# Altium footprint library TeCrea-Misc.PCBLIB: 105 footprints (part 6 of 7)
Each footprint in its own frame and in the unit in brackets; x right, y up, seen from the top. Pads: shape width x height; smd on the part's side, far side on the other; paste and mask are expansions set on the pad; w line width, h text height; cw(c..) or ccw(c..) is an arc to the next point about the centre after c.
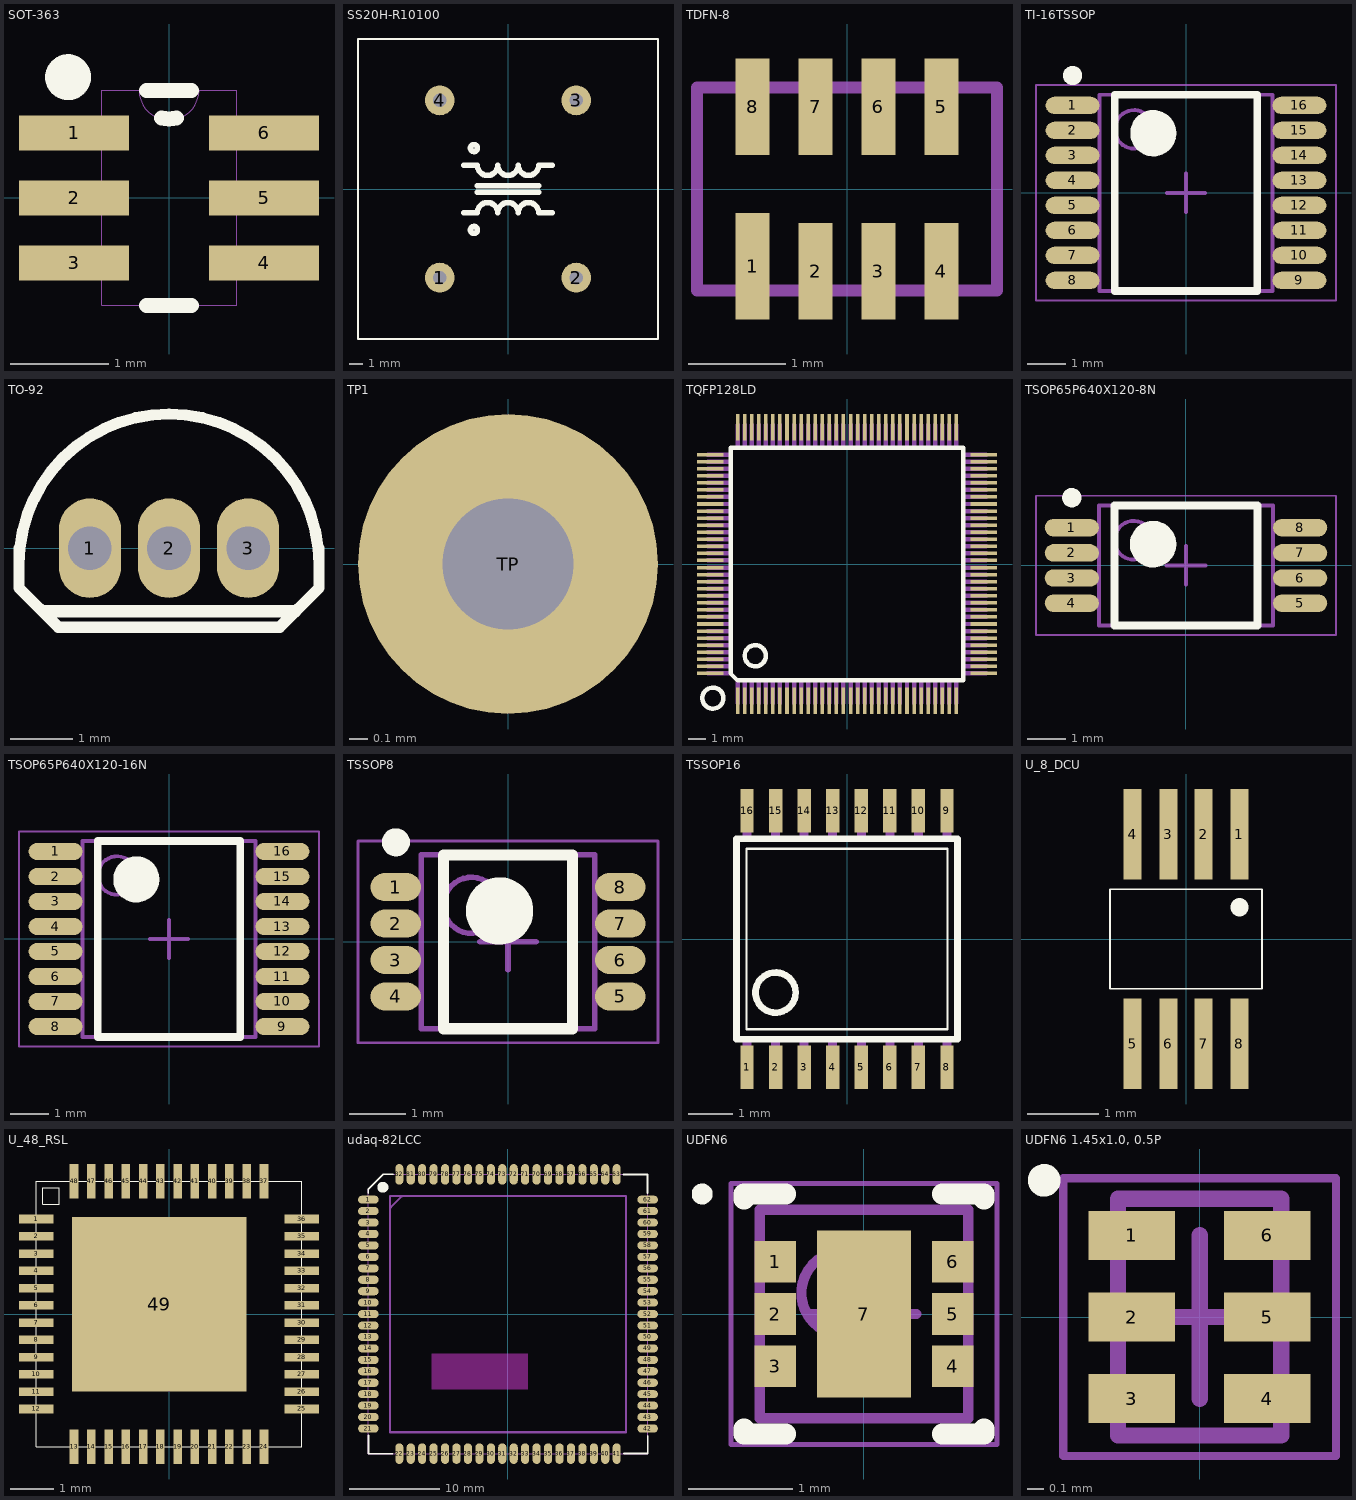
[diagram p5: the footprints below, top view; thin cyan lines are the x and y axes]

## SOT-363 [mil]
pads (6):
  rect 44x14 smd: 1(-38,26) 2(-38,0) 3(-38,-26) 4(38,-26) 5(38,0) 6(38,26)
Top Overlay:
  circle w10: c-40.35,48.23 r4.18
  lines w6: -9,-43 9,-43 ; -9,43 9,43 ; -3,32 ccw(c0,42.13) 3,32
Mechanical 16:
  lines w0: -27,-31 -27,-20 ; -27,-31 -27,-43 27,-43 27,-31 ; -27,-31 -43,-31 -43,-20 -27,-20 ; -27,-20 -27,-6 ; -27,-6 -27,6 ; -27,-6 -43,-6 -43,6 -27,6 ; -27,6 -27,20 ; -27,20 -27,31 ; -27,20 -43,20 -43,31 -27,31 ; -27,31 -27,43 -12,43 ; -12,43 ccw(c0,43) 12,43 ; -12,43 12,43 ; 12,43 27,43 27,31 ; 27,-31 27,-20 ; 27,-31 43,-31 43,-20 27,-20 ; 27,-20 27,-6 ; 27,-6 27,6 ; 27,-6 43,-6 43,6 27,6 ; 27,6 27,20 ; 27,20 27,31 ; 27,20 43,20 43,31 27,31
3D body "SOT363.step": height 39.37, standoff 0, extent -45.27,-41.34 45.28,41.34

## SS20H-R10100 [mm]
pads (4):
  round 2.184 hole 1: 1(-5,-6.5) 2(5,-6.5) 3(5,6.5) 4(-5,6.5)
Top Overlay:
  circle w0.406: c-2.5,3 r0.25
  circle w0.406: c-2.5,-3 r0.25
  lines w0.127: -11,-11 11,-11 11,11 -11,11 -11,-11
  lines w0.406: -3.25,-1.75 -2.25,-1.75 cw(c-1.5,-1.75) -0.75,-1.75 cw(c0,-1.75) 0.75,-1.75 cw(c1.5,-1.75) 2.25,-1.75 3.25,-1.75 ; -3.25,1.75 -2.25,1.75 ccw(c-1.5,1.75) -0.75,1.75 ccw(c0,1.75) 0.75,1.75 ccw(c1.5,1.75) 2.25,1.75 3.25,1.75 ; -2.25,-0.25 2.25,-0.25 ; -2.25,0.25 2.25,0.25
3D body "User Library-Kemet_Filter_SS20H.step": height 18.5, standoff -3.5, extent -11,-11 11,11

## TDFN-8 [mm]
pads (8):
  rect 0.35x1.1 smd: 1(-0.975,-0.8)
  rect 0.35x1 smd: 2(-0.325,-0.85) 3(0.325,-0.85) 4(0.975,-0.85) 5(0.975,0.85) 6(0.325,0.85) 7(-0.325,0.85) 8(-0.975,0.85)
Mechanical 16:
  lines w0.127: -1.55,-1.05 -1.55,1.05 1.55,1.05 1.55,-1.05 -1.55,-1.05
3D body: height 0.75, standoff 0, extent -1.549,-1.041 1.549,1.016
3D body: height 0.75, standoff 0, extent -1.422,-0.914 -1.168,-0.66

## TI-16TSSOP [mm]
height 1.2
pads (16):
  oval 1.4x0.45 smd: 1(-2.95,2.275) 2(-2.95,1.625) 3(-2.95,0.975) 4(-2.95,0.325) 5(-2.95,-0.325) 6(-2.95,-0.975) 7(-2.95,-1.625) 8(-2.95,-2.275) 9(2.95,-2.275) 10(2.95,-1.625) 11(2.95,-0.975) 12(2.95,-0.325) 13(2.95,0.325) 14(2.95,0.975) 15(2.95,1.625) 16(2.95,2.275)
Top Overlay:
  circle w0.25: c-2.95,3.05 r0.125
  circle w0.6: c-0.85,1.55 r0.3
  lines w0.2: -1.85,-2.55 -1.85,2.55 1.85,2.55 1.85,-2.55 -1.85,-2.55
Courtyard Top:
  lines w0.05: -3.9,-2.8 -3.9,2.8 3.9,2.8 3.9,-2.8 -3.9,-2.8
  lines w0.1: -0.5,0 0.5,0 ; 0,-0.5 0,0.5
Assembly Top:
  circle w0.1: c-1.35,1.65 r0.5
  lines w0.1: -2.25,-2.55 -2.25,2.55 2.25,2.55 2.25,-2.55 -2.25,-2.55
3D body "TI-16TSSOP.step": height 1.2, standoff 0, extent -3.2,-2.55 3.2,2.55

## TO-92 [mm]
pads (3):
  oval 1x1.6 hole 0.7: 1(-48.26,0) 2(-46.99,0) 3(-45.72,0)
Top Overlay:
  lines w0.18: -49.4,-0.254 cw(c-46.99,-0.254) -44.58,-0.254 ; -49.4,0 -49.4,-0.638 -48.768,-1.27 -45.212,-1.27 -44.58,-0.638 -44.58,0
  lines w0.2: -48.979,-1.016 -44.958,-1.016

## TP1 [mm] "TestPoint"
pads (1):
  round 1.6 hole 0.7: TP(0,0)
3D body "p13-4023.stp": height 14.95, standoff -1.6, extent -0.45,-0.45 0.45,0.45

## TQFP128LD [mm]
pads (128):
  rect 0.2x1.5 smd: 1(-6.2,-7.75) 2(-5.8,-7.75) 3(-5.4,-7.75) 4(-5,-7.75) 5(-4.6,-7.75) 6(-4.2,-7.75) 7(-3.8,-7.75) 8(-3.4,-7.75) 9(-3,-7.75) 10(-2.6,-7.75) 11(-2.2,-7.75) 12(-1.8,-7.75) 13(-1.4,-7.75) 14(-1,-7.75) 15(-0.6,-7.75) 16(-0.2,-7.75) 17(0.2,-7.75) 18(0.6,-7.75) 19(1,-7.75) 20(1.4,-7.75) 21(1.8,-7.75) 22(2.2,-7.75) 23(2.6,-7.75) 24(3,-7.75) 25(3.4,-7.75) 26(3.8,-7.75) 27(4.2,-7.75) 28(4.6,-7.75) 29(5,-7.75) 30(5.4,-7.75) 31(5.8,-7.75) 32(6.2,-7.75) 65(6.2,7.75) 66(5.8,7.75) 67(5.4,7.75) 68(5,7.75) 69(4.6,7.75) 70(4.2,7.75) 71(3.8,7.75) 72(3.4,7.75) 73(3,7.75) 74(2.6,7.75) 75(2.2,7.75) 76(1.8,7.75) 77(1.4,7.75) 78(1,7.75) 79(0.6,7.75) 80(0.2,7.75) 81(-0.2,7.75) 82(-0.6,7.75) 83(-1,7.75) 84(-1.4,7.75) 85(-1.8,7.75) 86(-2.2,7.75) 87(-2.6,7.75) 88(-3,7.75) 89(-3.4,7.75) 90(-3.8,7.75) 91(-4.2,7.75) 92(-4.6,7.75) 93(-5,7.75) 94(-5.4,7.75) 95(-5.8,7.75) 96(-6.2,7.75)
  rect 1.5x0.2 smd: 33(7.75,-6.2) 34(7.75,-5.8) 35(7.75,-5.4) 36(7.75,-5) 37(7.75,-4.6) 38(7.75,-4.2) 39(7.75,-3.8) 40(7.75,-3.4) 41(7.75,-3) 42(7.75,-2.6) 43(7.75,-2.2) 44(7.75,-1.8) 45(7.75,-1.4) 46(7.75,-1) 47(7.75,-0.6) 48(7.75,-0.2) 49(7.75,0.2) 50(7.75,0.6) 51(7.75,1) 52(7.75,1.4) 53(7.75,1.8) 54(7.75,2.2) 55(7.75,2.6) 56(7.75,3) 57(7.75,3.4) 58(7.75,3.8) 59(7.75,4.2) 60(7.75,4.6) 61(7.75,5) 62(7.75,5.4) 63(7.75,5.8) 64(7.75,6.2) 97(-7.75,6.2) 98(-7.75,5.8) 99(-7.75,5.4) 100(-7.75,5) 101(-7.75,4.6) 102(-7.75,4.2) 103(-7.75,3.8) 104(-7.75,3.4) 105(-7.75,3) 106(-7.75,2.6) 107(-7.75,2.2) 108(-7.75,1.8) 109(-7.75,1.4) 110(-7.75,1) 111(-7.75,0.6) 112(-7.75,0.2) 113(-7.75,-0.2) 114(-7.75,-0.6) 115(-7.75,-1) 116(-7.75,-1.4) 117(-7.75,-1.8) 118(-7.75,-2.2) 119(-7.75,-2.6) 120(-7.75,-3) 121(-7.75,-3.4) 122(-7.75,-3.8) 123(-7.75,-4.2) 124(-7.75,-4.6) 125(-7.75,-5) 126(-7.75,-5.4) 127(-7.75,-5.8) 128(-7.75,-6.2)
Top Overlay:
  circle w0.254: c-5.2,-5.2 r0.6
  circle w0.254: c-7.6,-7.6 r0.6
  lines w0.254: -6.6,-6.2 -6.2,-6.6 6.6,-6.6 6.6,6.6 -6.6,6.6 -6.6,-6.2
Mechanical 16:
  lines w0.254: -7.9,-6.2 -6.6,-6.2 ; -7.9,-5.8 -6.6,-5.8 ; -7.9,-5.4 -6.6,-5.4 ; -7.9,-5 -6.6,-5 ; -7.9,-4.6 -6.6,-4.6 ; -7.9,-4.2 -6.6,-4.2 ; -7.9,-3.8 -6.6,-3.8 ; -7.9,-3.4 -6.6,-3.4 ; -7.9,-3 -6.6,-3 ; -7.9,-2.6 -6.6,-2.6 ; -7.9,-2.2 -6.6,-2.2 ; -7.9,-1.8 -6.6,-1.8 ; -7.9,-1.4 -6.6,-1.4 ; -7.9,-1 -6.6,-1 ; -7.9,-0.6 -6.6,-0.6 ; -7.9,-0.2 -6.6,-0.2 ; -7.9,0.2 -6.6,0.2 ; -7.9,0.6 -6.6,0.6 ; -7.9,1 -6.6,1 ; -7.9,1.4 -6.6,1.4 ; -7.9,1.8 -6.6,1.8 ; -7.9,2.2 -6.6,2.2 ; -7.9,2.6 -6.6,2.6 ; -7.9,3 -6.6,3 ; -7.9,3.4 -6.6,3.4 ; -7.9,3.8 -6.6,3.8 ; -7.9,4.2 -6.6,4.2 ; -7.9,4.6 -6.6,4.6 ; -7.9,5 -6.6,5 ; -7.9,5.4 -6.6,5.4 ; -7.9,5.8 -6.6,5.8 ; -7.9,6.2 -6.6,6.2 ; -6.2,-7.9 -6.2,-6.6 ; -6.2,6.6 -6.2,7.9 ; -5.8,-7.9 -5.8,-6.6 ; -5.8,6.6 -5.8,7.9 ; -5.4,-7.9 -5.4,-6.6 ; -5.4,6.6 -5.4,7.9 ; -5,-7.9 -5,-6.6 ; -5,6.6 -5,7.9 ; -4.6,-7.9 -4.6,-6.6 ; -4.6,6.6 -4.6,7.9 ; -4.2,-7.9 -4.2,-6.6 ; -4.2,6.6 -4.2,7.9 ; -3.8,-7.9 -3.8,-6.6 ; -3.8,6.6 -3.8,7.9 ; -3.4,-7.9 -3.4,-6.6 ; -3.4,6.6 -3.4,7.9 ; -3,-7.9 -3,-6.6 ; -3,6.6 -3,7.9 ; -2.6,-7.9 -2.6,-6.6 ; -2.6,6.6 -2.6,7.9 ; -2.2,-7.9 -2.2,-6.6 ; -2.2,6.6 -2.2,7.9 ; -1.8,-7.9 -1.8,-6.6 ; -1.8,6.6 -1.8,7.9 ; -1.4,-7.9 -1.4,-6.6 ; -1.4,6.6 -1.4,7.9 ; -1,-7.9 -1,-6.6 ; -1,6.6 -1,7.9 ; -0.6,-7.9 -0.6,-6.6 ; -0.6,6.6 -0.6,7.9 ; -0.2,-7.9 -0.2,-6.6 ; -0.2,6.6 -0.2,7.9 ; 0.2,-7.9 0.2,-6.6 ; 0.2,6.6 0.2,7.9 ; 0.6,-7.9 0.6,-6.6 ; 0.6,6.6 0.6,7.9 ; 1,-7.9 1,-6.6 ; 1,6.6 1,7.9 ; 1.4,-7.9 1.4,-6.6 ; 1.4,6.6 1.4,7.9 ; 1.8,-7.9 1.8,-6.6 ; 1.8,6.6 1.8,7.9 ; 2.2,-7.9 2.2,-6.6 ; 2.2,6.6 2.2,7.9 ; 2.6,-7.9 2.6,-6.6 ; 2.6,6.6 2.6,7.9 ; 3,-7.9 3,-6.6 ; 3,6.6 3,7.9 ; 3.4,-7.9 3.4,-6.6 ; 3.4,6.6 3.4,7.9 ; 3.8,-7.9 3.8,-6.6 ; 3.8,6.6 3.8,7.9 ; 4.2,-7.9 4.2,-6.6 ; 4.2,6.6 4.2,7.9 ; 4.6,-7.9 4.6,-6.6 ; 4.6,6.6 4.6,7.9 ; 5,-7.9 5,-6.6 ; 5,6.6 5,7.9 ; 5.4,-7.9 5.4,-6.6 ; 5.4,6.6 5.4,7.9 ; 5.8,-7.9 5.8,-6.6 ; 5.8,6.6 5.8,7.9 ; 6.2,-7.9 6.2,-6.6 ; 6.2,6.6 6.2,7.9 ; 6.6,-6.2 7.9,-6.2 ; 6.6,-5.8 7.9,-5.8 ; 6.6,-5.4 7.9,-5.4 ; 6.6,-5 7.9,-5 ; 6.6,-4.6 7.9,-4.6 ; 6.6,-4.2 7.9,-4.2 ; 6.6,-3.8 7.9,-3.8 ; 6.6,-3.4 7.9,-3.4 ; 6.6,-3 7.9,-3 ; 6.6,-2.6 7.9,-2.6 ; 6.6,-2.2 7.9,-2.2 ; 6.6,-1.8 7.9,-1.8 ; 6.6,-1.4 7.9,-1.4 ; 6.6,-1 7.9,-1 ; 6.6,-0.6 7.9,-0.6 ; 6.6,-0.2 7.9,-0.2 ; 6.6,0.2 7.9,0.2 ; 6.6,0.6 7.9,0.6 ; 6.6,1 7.9,1 ; 6.6,1.4 7.9,1.4 ; 6.6,1.8 7.9,1.8 ; 6.6,2.2 7.9,2.2 ; 6.6,2.6 7.9,2.6 ; 6.6,3 7.9,3 ; 6.6,3.4 7.9,3.4 ; 6.6,3.8 7.9,3.8 ; 6.6,4.2 7.9,4.2 ; 6.6,4.6 7.9,4.6 ; 6.6,5 7.9,5 ; 6.6,5.4 7.9,5.4 ; 6.6,5.8 7.9,5.8 ; 6.6,6.2 7.9,6.2
3D body "TQFP128_14x14mm_Pitch0.4mm.step": height 1.1, standoff 0, extent -7.975,-8 8.025,8

## TSOP65P640X120-8N [mm] "TSOP, 8-Leads, Body 3,00x4,40mm, Pitch 0,65mm, IPC Medium Density"
height 1.2
pads (8):
  oval 1.4x0.45 smd: 1(-2.95,0.975) 2(-2.95,0.325) 3(-2.95,-0.325) 4(-2.95,-0.975) 5(2.95,-0.975) 6(2.95,-0.325) 7(2.95,0.325) 8(2.95,0.975)
Top Overlay:
  circle w0.25: c-2.95,1.75 r0.125
  circle w0.6: c-0.85,0.55 r0.3
  lines w0.2: -1.85,-1.55 -1.85,1.55 1.85,1.55 1.85,-1.55 -1.85,-1.55
Courtyard Top:
  lines w0.05: -3.875,-1.8 -3.875,1.8 3.875,1.8 3.875,-1.8 -3.875,-1.8
  lines w0.1: -0.5,0 0.5,0 ; 0,-0.5 0,0.5
Assembly Top:
  circle w0.1: c-1.35,0.65 r0.5
  lines w0.1: -2.25,-1.55 -2.25,1.55 2.25,1.55 2.25,-1.55 -2.25,-1.55
3D body "TSOP65P640X120-8N.step": height 1.2, standoff 0, extent -3.2,-1.55 3.2,1.55

## TSOP65P640X120-16N [mm] "TSOP, 16-Leads, Body 5.00x4.40mm, Pitch 0.65mm, IPC Medium Density"
height 1.2
pads (16):
  oval 1.4x0.45 smd: 1(-2.95,2.275) 2(-2.95,1.625) 3(-2.95,0.975) 4(-2.95,0.325) 5(-2.95,-0.325) 6(-2.95,-0.975) 7(-2.95,-1.625) 8(-2.95,-2.275) 9(2.95,-2.275) 10(2.95,-1.625) 11(2.95,-0.975) 12(2.95,-0.325) 13(2.95,0.325) 14(2.95,0.975) 15(2.95,1.625) 16(2.95,2.275)
Top Overlay:
  circle w0.6: c-0.85,1.55 r0.3
  lines w0.2: -1.85,-2.55 1.85,-2.55 1.85,2.55 -1.85,2.55 -1.85,-2.55
Mechanical 13:
  circle w0.1: c-1.35,1.65 r0.5
  lines w0.1: -2.25,-2.55 2.25,-2.55 2.25,2.55 -2.25,2.55 -2.25,-2.55
Mechanical 15:
  lines w0.05: -3.9,-2.8 3.9,-2.8 3.9,2.8 -3.9,2.8 -3.9,-2.8
  lines w0.1: -0.5,0 0.5,0 ; 0,-0.5 0,0.5
3D body "TSOP65P640X120-16N.step": height 1.2, standoff 0, extent -3.2,-2.55 3.2,2.55

## TSSOP8 [mm] "TSOP, 8-Leads, Body 3.00x3.00mm, Pitch 0.65mm, IPC Medium Density"
height 1.1
pads (8):
  oval 0.9x0.5 smd: 1(-2,0.975) 2(-2,0.325) 3(-2,-0.325) 4(-2,-0.975) 5(2,-0.975) 6(2,-0.325) 7(2,0.325) 8(2,0.975)
Top Overlay:
  circle w0.25: c-2,1.775 r0.125
  circle w0.6: c-0.15,0.55 r0.3
  lines w0.2: -1.15,-1.55 -1.15,1.55 1.15,1.55 1.15,-1.55 -1.15,-1.55
Mechanical 13:
  circle w0.1: c-0.65,0.65 r0.5
  lines w0.1: -1.55,-1.55 -1.55,1.55 1.55,1.55 1.55,-1.55 -1.55,-1.55
Mechanical 15:
  lines w0.05: -2.675,-1.8 -2.675,1.8 2.675,1.8 2.675,-1.8 -2.675,-1.8
  lines w0.1: -0.5,0 0.5,0 ; 0,-0.5 0,0.5
3D body "TSSOP8.step": height 1.1, standoff 0.01, extent -1.993,-1.55 1.993,1.55

## TSSOP16 [mil]
pads (16):
  rect 12x39 smd: 1(-89.57,-114.87) 2(-63.98,-114.87) 3(-38.39,-114.87) 4(-12.8,-114.87) 5(12.8,-114.87) 6(38.39,-114.87) 7(63.98,-114.87) 8(89.57,-114.87) 9(89.57,114.87) 10(63.98,114.87) 11(38.39,114.87) 12(12.8,114.87) 13(-12.8,114.87) 14(-38.39,114.87) 15(-63.98,114.87) 16(-89.57,114.87)
Top Overlay:
  circle w6: c-64,-48 r18
  lines w2: -90,-80.87 -90,80.87 90,80.87 90,-80.87 -90,-80.87
  lines w6: -99,-89.87 -99,89.87 99,89.87 99,-89.87 -99,-89.87
Mechanical 16:
  rectangle: -93.57,89.87 -85.57,122.87
  rectangle: -67.98,89.87 -59.98,122.87
  rectangle: -42.39,89.87 -34.39,122.87
  rectangle: -16.8,89.87 -8.8,122.87
  rectangle: 8.8,89.87 16.8,122.87
  rectangle: 34.39,89.87 42.39,122.87
  rectangle: 59.98,89.87 67.98,122.87
  rectangle: 85.57,89.87 93.57,122.87
  rectangle: 85.57,-122.87 93.57,-89.87
  rectangle: 59.98,-122.87 67.98,-89.87
  rectangle: 34.39,-122.87 42.39,-89.87
  rectangle: 8.8,-122.87 16.8,-89.87
  rectangle: -16.8,-122.87 -8.8,-89.87
  rectangle: -42.39,-122.87 -34.39,-89.87
  rectangle: -67.98,-122.87 -59.98,-89.87
  rectangle: -93.57,-122.87 -85.57,-89.87
3D body "TSSOP16-1.step": height 43.31, standoff 0, extent -98.42,-124.99 98.43,126.97

## U_8_DCU [mil] "U_8_DCU"
pads (8):
  rect 10x50 smd mask+2: 1(29.5,58) 2(9.8,58) 3(-9.8,58) 4(-29.5,58) 5(-29.5,-58) 6(-9.8,-58) 7(9.8,-58) 8(29.5,-58)
Top Overlay:
  lines w1: -42,-27.56 42,-27.56 42,27.56 -42,27.56 -42,-27.56
  lines w10: 29.52,17.47 ccw(c19.53,17.72) 29.53,17.72
3D body "VFSOP8.step": height 35.43, standoff 0.12, extent -41.33,-60.99 41.34,60.99

## U_48_RSL [mil] "U_48_RSL"
pads (49):
  rect 31.5x7.87 smd mask+2: 1(-121.06,86.61) 2(-121.06,70.87) 3(-121.06,55.12) 4(-121.06,39.37) 5(-121.06,23.62) 6(-121.06,7.87) 7(-121.06,-7.87) 8(-121.06,-23.62) 9(-121.06,-39.37) 10(-121.06,-55.12) 11(-121.06,-70.87) 12(-121.06,-86.61) 25(121.06,-86.61) 26(121.06,-70.87) 27(121.06,-55.12) 28(121.06,-39.37) 29(121.06,-23.62) 30(121.06,-7.87) 31(121.06,7.87) 32(121.06,23.62) 33(121.06,39.37) 34(121.06,55.12) 35(121.06,70.87) 36(121.06,86.61)
  rect 7.87x31.5 smd mask+2: 13(-86.61,-121.06) 14(-70.87,-121.06) 15(-55.12,-121.06) 16(-39.37,-121.06) 17(-23.62,-121.06) 18(-7.87,-121.06) 19(7.87,-121.06) 20(23.62,-121.06) 21(39.37,-121.06) 22(55.12,-121.06) 23(70.87,-121.06) 24(86.61,-121.06) 37(86.61,121.06) 38(70.87,121.06) 39(55.12,121.06) 40(39.37,121.06) 41(23.62,121.06) 42(7.87,121.06) 43(-7.87,121.06) 44(-23.62,121.06) 45(-39.37,121.06) 46(-55.12,121.06) 47(-70.87,121.06) 48(-86.61,121.06)
  rect 159.45x159.45 smd mask+2: 49(-8.86,8.86)
Top Overlay:
  lines w1: -121.06,-121.06 121.06,-121.06 121.06,121.06 -121.06,121.06 -121.06,-121.06 ; -115,100 -100,100 -100,115 -115,115 -115,100
Top Paste:
  pour cut-out: 25.64,-13.64 25.64,31.36 70.64,31.36 70.64,-13.64
  pour cut-out: -31.36,-13.64 -31.36,31.36 13.64,31.36 13.64,-13.64
  pour cut-out: -88.36,-13.64 -88.36,31.36 -43.36,31.36 -43.36,-13.64
  pour cut-out: -88.36,43.36 -88.36,88.36 -43.36,88.36 -43.36,43.36
  pour cut-out: -31.36,43.36 -31.36,88.36 13.64,88.36 13.64,43.36
  pour cut-out: 25.64,43.36 25.64,88.36 70.64,88.36 70.64,43.36
  pour cut-out: -88.36,-70.64 -88.36,-25.64 -43.36,-25.64 -43.36,-70.64
  pour cut-out: -31.36,-70.64 -31.36,-25.64 13.64,-25.64 13.64,-70.64
  pour cut-out: 25.64,-70.64 25.64,-25.64 70.64,-25.64 70.64,-70.64
3D body "QFN48_6x6.step": height 39.37, standoff 0, extent -121.45,-121.45 121.46,121.46

## udaq-82LCC [mm]
pads (82):
  rrect100% 2.3x0.9 smd: 1(-15.5,12.69) 2(-15.5,11.42) 3(-15.5,10.15) 4(-15.5,8.88) 5(-15.5,7.61) 6(-15.5,6.34) 7(-15.5,5.07) 8(-15.5,3.8) 9(-15.5,2.53) 10(-15.5,1.26) 11(-15.5,-0.01) 12(-15.5,-1.28) 13(-15.5,-2.55) 14(-15.5,-3.82) 15(-15.5,-5.09) 16(-15.5,-6.36) 17(-15.5,-7.63) 18(-15.5,-8.9) 19(-15.5,-10.17) 20(-15.5,-11.44) 21(-15.5,-12.71) 42(15.5,-12.71) 43(15.5,-11.44) 44(15.5,-10.17) 45(15.5,-8.9) 46(15.5,-7.63) 47(15.5,-6.36) 48(15.5,-5.09) 49(15.5,-3.82) 50(15.5,-2.55) 51(15.5,-1.28) 52(15.5,-0.01) 53(15.5,1.26) 54(15.5,2.53) 55(15.5,3.8) 56(15.5,5.07) 57(15.5,6.34) 58(15.5,7.61) 59(15.5,8.88) 60(15.5,10.15) 61(15.5,11.42) 62(15.5,12.69)
  rrect100% 0.9x2.3 smd: 22(-12.065,-15.5) 23(-10.795,-15.5) 24(-9.525,-15.5) 25(-8.255,-15.5) 26(-6.985,-15.5) 27(-5.715,-15.5) 28(-4.445,-15.5) 29(-3.175,-15.5) 30(-1.905,-15.5) 31(-0.635,-15.5) 32(0.635,-15.5) 33(1.905,-15.5) 34(3.175,-15.5) 35(4.445,-15.5) 36(5.715,-15.5) 37(6.985,-15.5) 38(8.255,-15.5) 39(9.525,-15.5) 40(10.795,-15.5) 41(12.065,-15.5) 63(12.065,15.5) 64(10.795,15.5) 65(9.525,15.5) 66(8.255,15.5) 67(6.985,15.5) 68(5.715,15.5) 69(4.445,15.5) 70(3.175,15.5) 71(1.905,15.5) 72(0.635,15.5) 73(-0.635,15.5) 74(-1.905,15.5) 75(-3.175,15.5) 76(-4.445,15.5) 77(-5.715,15.5) 78(-6.985,15.5) 79(-8.255,15.5) 80(-9.525,15.5) 81(-10.795,15.5) 82(-12.065,15.5)
Top Layer keep-out:
  rectangle: -8.484,-8.354 2.235,-4.366
Top Overlay:
  circle w1: c-13.894,14.072 r0.105
  lines w0.2: -15.519,13.411 -15.519,13.843 -13.843,15.519 -12.751,15.519 ; -15.494,-13.462 -15.494,-15.519 -12.802,-15.519 ; 12.802,15.494 15.494,15.494 15.494,13.411 ; 12.852,-15.494 15.519,-15.494 15.519,-13.513
Mechanical 1:
  lines w0.1: -15.5,-15.5 -15.5,-12.71 -15.5,12.69 -15.5,13.862 -13.862,15.5 -12.065,15.5 12.065,15.5 15.5,15.5 15.5,12.69 15.5,-12.71 15.5,-15.5 -12.065,-15.5 -15.5,-15.5
  lines w0.254: -13.01,11.845 -11.786,13.07 ; -13.105,-13.115 -13.105,13.095 13.105,13.095 13.105,-13.115 -13.105,-13.115
3D body "uDAQ.step": height 5.87, standoff 0.01, extent -15.519,-15.481 15.481,15.519

## UDFN6 [mm] "PSON, 6-Leads, Body 2,00x2,00mm, Pitch 0,50mm, Thermal Pad 1,60x0,90mm, IPC Medium Density"
height 0.55
pads (7):
  rect 0.4x0.4 smd: 1(-0.85,0.5) 2(-0.85,0) 3(-0.85,-0.5) 4(0.85,-0.5) 5(0.85,0) 6(0.85,0.5)
  rect 0.9x1.6 smd: 7(0,0)
Top Overlay:
  circle w0.1: c-1.55,1.15 r0.05
  lines w0.2: -1.15,-1.1 -1.15,-1.15 -0.75,-1.15 ; -1.15,1.1 -1.15,1.15 -0.75,1.15 ; 0.75,-1.15 1.15,-1.15 1.15,-1.1 ; 0.75,1.15 1.15,1.15 1.15,1.1
Mechanical 13:
  circle w0.1: c-0.2,0.2 r0.4
  lines w0.1: -1,-1 1,-1 1,1 -1,1 -1,-1
Mechanical 15:
  lines w0.05: -1.275,-1.25 1.275,-1.25 1.275,1.25 -1.275,1.25 -1.275,-1.25
  lines w0.1: -0.5,0 0.5,0 ; 0,-0.5 0,0.5
3D body "UDFN6.step": height 0.55, standoff 0, extent -1.001,-1 1.001,1

## UDFN6 1.45x1.0, 0.5P [mm]
height 0.55
pads (6):
  rect 0.53x0.3 smd: 1(-0.415,0.5) 2(-0.415,0) 3(-0.415,-0.5) 4(0.415,-0.5) 5(0.415,0) 6(0.415,0.5)
Top Overlay:
  circle w0.1: c-0.952,0.837 r0.05
Courtyard Top:
  lines w0.05: -0.835,-0.85 0.835,-0.85 0.835,0.85 -0.835,0.85 -0.835,-0.85
  lines w0.1: -0.5,0 0.5,0 ; 0,-0.5 0,0.5
Assembly Top:
  lines w0.1: -0.5,-0.725 0.5,-0.725 0.5,0.725 -0.5,0.725 -0.5,-0.725
3D body "UDFN6 1.45x1.0, 0.5P.step": height 0.55, standoff 0, extent -0.55,-0.725 0.55,0.725